# Altium footprint library WR-TBL_Rising Cage Clamp.PcbLib: 435 footprints (part 7 of 28)
Each footprint in its own frame and in the unit in brackets; x right, y up, seen from the top. Pads: shape width x height; smd on the part's side, far side on the other; paste and mask are expansions set on the pad; w line width, h text height; cw(c..) or ccw(c..) is an arc to the next point about the centre after c.
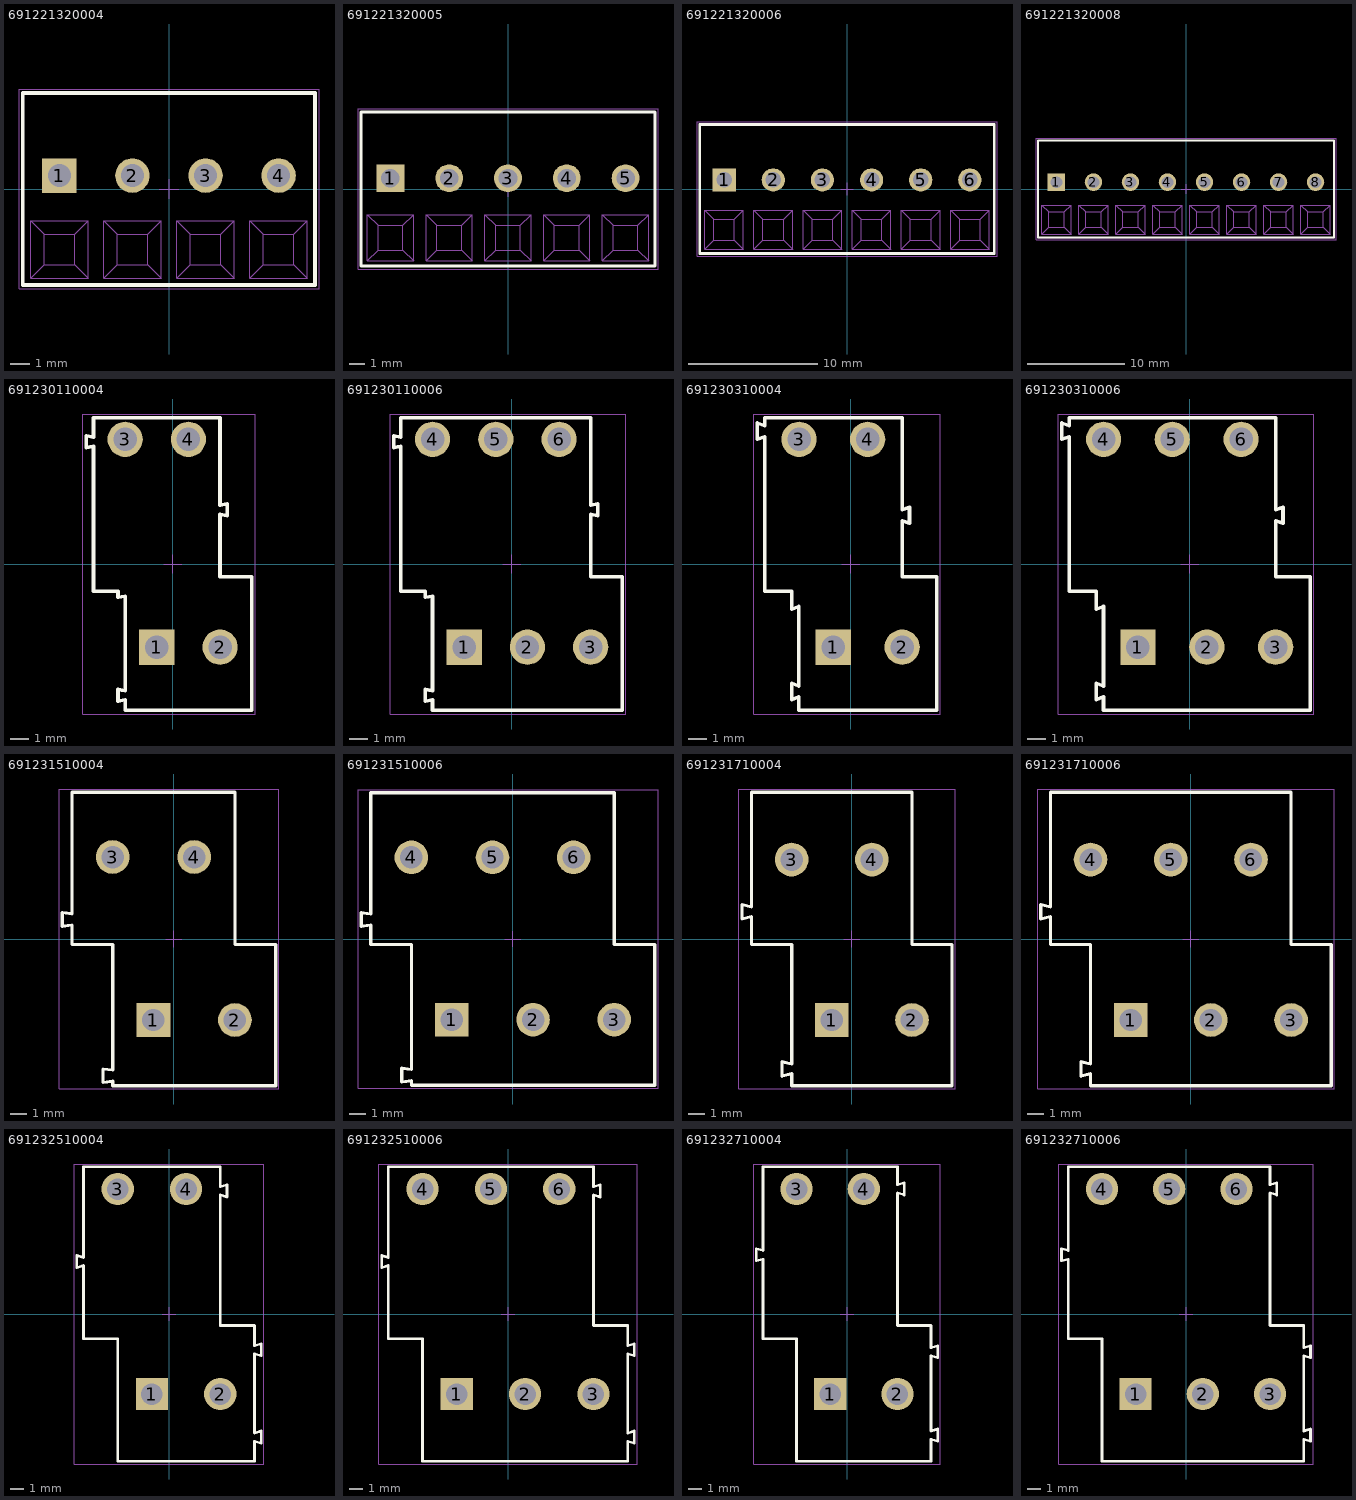
[diagram p6: the footprints below, top view; thin cyan lines are the x and y axes]

## 691221320004 [mm] "3,81mm - modular - green - 55° wire entry - Cage clamp - 04p"
height 9.5
pads (4):
  rect 1.8x1.8 hole 1.2: 1(-5.715,0.7)
  round 1.8 hole 1.2: 2(-1.905,0.7) 3(1.905,0.7) 4(5.715,0.7)
Top Overlay:
  lines w0.2: -7.62,-5 7.62,-5 7.62,5 -7.62,5 -7.62,-5
Mechanical 13:
  lines w0.05: -7.215,-4.66 -4.215,-4.66 ; -7.215,-4.66 -7.215,-1.66 ; -7.215,-4.66 -6.515,-3.96 ; -7.215,-1.66 -4.215,-1.66 ; -7.215,-1.66 -6.515,-2.36 ; -6.515,-3.96 -6.515,-2.36 ; -6.515,-3.96 -4.915,-3.96 ; -6.515,-2.36 -4.915,-2.36 ; -4.915,-3.96 -4.915,-2.36 ; -4.915,-3.96 -4.215,-4.66 ; -4.915,-2.36 -4.215,-1.66 ; -4.215,-4.66 -4.215,-1.66 ; -3.405,-4.66 -2.705,-3.96 ; -3.405,-4.66 -3.405,-1.66 ; -3.405,-4.66 -0.405,-4.66 ; -3.405,-1.66 -2.705,-2.36 ; -3.405,-1.66 -0.405,-1.66 ; -2.705,-3.96 -1.105,-3.96 ; -2.705,-3.96 -2.705,-2.36 ; -2.705,-2.36 -1.105,-2.36 ; -1.105,-3.96 -0.405,-4.66 ; -1.105,-3.96 -1.105,-2.36 ; -1.105,-2.36 -0.405,-1.66 ; -0.405,-4.66 -0.405,-1.66 ; 0.405,-4.66 1.105,-3.96 ; 0.405,-4.66 0.405,-1.66 ; 0.405,-4.66 3.405,-4.66 ; 0.405,-1.66 1.105,-2.36 ; 0.405,-1.66 3.405,-1.66 ; 1.105,-3.96 2.705,-3.96 ; 1.105,-3.96 1.105,-2.36 ; 1.105,-2.36 2.705,-2.36 ; 2.705,-3.96 3.405,-4.66 ; 2.705,-3.96 2.705,-2.36 ; 2.705,-2.36 3.405,-1.66 ; 3.405,-4.66 3.405,-1.66 ; 4.215,-4.66 4.915,-3.96 ; 4.215,-4.66 4.215,-1.66 ; 4.215,-4.66 7.215,-4.66 ; 4.215,-1.66 4.915,-2.36 ; 4.215,-1.66 7.215,-1.66 ; 4.915,-3.96 6.515,-3.96 ; 4.915,-3.96 4.915,-2.36 ; 4.915,-2.36 6.515,-2.36 ; 6.515,-3.96 7.215,-4.66 ; 6.515,-3.96 6.515,-2.36 ; 6.515,-2.36 7.215,-1.66 ; 7.215,-4.66 7.215,-1.66
  lines w0.1: -7.62,-5 -7.62,5 7.62,5 7.62,-5 -7.62,-5
Mechanical 15:
  lines w0.05: -0.5,0 0.5,0 ; 0,-0.5 0,0.5 ; -7.82,-5.2 7.82,-5.2 7.82,5.2 -7.82,5.2 -7.82,-5.2
3D body "691221320004.stp": height 9.55, standoff -3.45, extent -7.62,-5 7.62,5

## 691221320005 [mm] "3,81mm - modular - green - 55° wire entry - Cage clamp - 05p"
height 9.5
pads (5):
  rect 1.8x1.8 hole 1.2: 1(-7.62,0.7)
  round 1.8 hole 1.2: 2(-3.81,0.7) 3(0,0.7) 4(3.81,0.7) 5(7.62,0.7)
Top Overlay:
  lines w0.2: -9.525,-5 -9.525,5 9.525,5 9.525,-5 -9.525,-5
Mechanical 13:
  lines w0.05: -9.12,-4.66 -8.42,-3.96 ; -9.12,-4.66 -9.12,-1.66 ; -9.12,-4.66 -6.12,-4.66 ; -9.12,-1.66 -8.42,-2.36 ; -9.12,-1.66 -6.12,-1.66 ; -8.42,-3.96 -6.82,-3.96 ; -8.42,-3.96 -8.42,-2.36 ; -8.42,-2.36 -6.82,-2.36 ; -6.82,-3.96 -6.12,-4.66 ; -6.82,-3.96 -6.82,-2.36 ; -6.82,-2.36 -6.12,-1.66 ; -6.12,-4.66 -6.12,-1.66 ; -5.31,-4.66 -2.31,-4.66 ; -5.31,-4.66 -5.31,-1.66 ; -5.31,-4.66 -4.61,-3.96 ; -5.31,-1.66 -2.31,-1.66 ; -5.31,-1.66 -4.61,-2.36 ; -4.61,-3.96 -4.61,-2.36 ; -4.61,-3.96 -3.01,-3.96 ; -4.61,-2.36 -3.01,-2.36 ; -3.01,-3.96 -3.01,-2.36 ; -3.01,-3.96 -2.31,-4.66 ; -3.01,-2.36 -2.31,-1.66 ; -2.31,-4.66 -2.31,-1.66 ; -1.5,-4.66 1.5,-4.66 ; -1.5,-4.66 -1.5,-1.66 ; -1.5,-4.66 -0.8,-3.96 ; -1.5,-1.66 1.5,-1.66 ; -1.5,-1.66 -0.8,-2.36 ; -0.8,-3.96 -0.8,-2.36 ; -0.8,-3.96 0.8,-3.96 ; -0.8,-2.36 0.8,-2.36 ; 0.8,-3.96 0.8,-2.36 ; 0.8,-3.96 1.5,-4.66 ; 0.8,-2.36 1.5,-1.66 ; 1.5,-4.66 1.5,-1.66 ; 2.31,-4.66 5.31,-4.66 ; 2.31,-4.66 2.31,-1.66 ; 2.31,-4.66 3.01,-3.96 ; 2.31,-1.66 5.31,-1.66 ; 2.31,-1.66 3.01,-2.36 ; 3.01,-3.96 3.01,-2.36 ; 3.01,-3.96 4.61,-3.96 ; 3.01,-2.36 4.61,-2.36 ; 4.61,-3.96 4.61,-2.36 ; 4.61,-3.96 5.31,-4.66 ; 4.61,-2.36 5.31,-1.66 ; 5.31,-4.66 5.31,-1.66 ; 6.12,-4.66 9.12,-4.66 ; 6.12,-4.66 6.12,-1.66 ; 6.12,-4.66 6.82,-3.96 ; 6.12,-1.66 9.12,-1.66 ; 6.12,-1.66 6.82,-2.36 ; 6.82,-3.96 6.82,-2.36 ; 6.82,-3.96 8.42,-3.96 ; 6.82,-2.36 8.42,-2.36 ; 8.42,-3.96 8.42,-2.36 ; 8.42,-3.96 9.12,-4.66 ; 8.42,-2.36 9.12,-1.66 ; 9.12,-4.66 9.12,-1.66
  lines w0.1: -9.525,-5 9.525,-5 9.525,5 -9.525,5 -9.525,-5
Mechanical 15:
  lines w0.05: -0.5,0 0.5,0 ; 0,-0.5 0,0.5 ; -9.725,-5.2 -9.725,5.2 9.725,5.2 9.725,-5.2 -9.725,-5.2
3D body "691221320005.stp": height 9.55, standoff -3.45, extent -9.525,-5 9.525,5

## 691221320006 [mm] "3,81mm - modular - green - 55° wire entry - Cage clamp - 06p"
height 9.5
pads (6):
  rect 1.8x1.8 hole 1.2: 1(-9.525,0.7)
  round 1.8 hole 1.2: 2(-5.715,0.7) 3(-1.905,0.7) 4(1.905,0.7) 5(5.715,0.7) 6(9.525,0.7)
Top Overlay:
  lines w0.2: -11.43,-5 -11.43,5 11.43,5 11.43,-5 -11.43,-5
Mechanical 13:
  lines w0.05: -11.025,-4.66 -10.325,-3.96 ; -11.025,-4.66 -11.025,-1.66 ; -11.025,-4.66 -8.025,-4.66 ; -11.025,-1.66 -10.325,-2.36 ; -11.025,-1.66 -8.025,-1.66 ; -10.325,-3.96 -8.725,-3.96 ; -10.325,-3.96 -10.325,-2.36 ; -10.325,-2.36 -8.725,-2.36 ; -8.725,-3.96 -8.025,-4.66 ; -8.725,-3.96 -8.725,-2.36 ; -8.725,-2.36 -8.025,-1.66 ; -8.025,-4.66 -8.025,-1.66 ; -7.215,-4.66 -4.215,-4.66 ; -7.215,-4.66 -7.215,-1.66 ; -7.215,-4.66 -6.515,-3.96 ; -7.215,-1.66 -4.215,-1.66 ; -7.215,-1.66 -6.515,-2.36 ; -6.515,-3.96 -6.515,-2.36 ; -6.515,-3.96 -4.915,-3.96 ; -6.515,-2.36 -4.915,-2.36 ; -4.915,-3.96 -4.915,-2.36 ; -4.915,-3.96 -4.215,-4.66 ; -4.915,-2.36 -4.215,-1.66 ; -4.215,-4.66 -4.215,-1.66 ; -3.405,-4.66 -0.405,-4.66 ; -3.405,-4.66 -3.405,-1.66 ; -3.405,-4.66 -2.705,-3.96 ; -3.405,-1.66 -0.405,-1.66 ; -3.405,-1.66 -2.705,-2.36 ; -2.705,-3.96 -2.705,-2.36 ; -2.705,-3.96 -1.105,-3.96 ; -2.705,-2.36 -1.105,-2.36 ; -1.105,-3.96 -1.105,-2.36 ; -1.105,-3.96 -0.405,-4.66 ; -1.105,-2.36 -0.405,-1.66 ; -0.405,-4.66 -0.405,-1.66 ; 0.405,-4.66 3.405,-4.66 ; 0.405,-4.66 0.405,-1.66 ; 0.405,-4.66 1.105,-3.96 ; 0.405,-1.66 3.405,-1.66 ; 0.405,-1.66 1.105,-2.36 ; 1.105,-3.96 1.105,-2.36 ; 1.105,-3.96 2.705,-3.96 ; 1.105,-2.36 2.705,-2.36 ; 2.705,-3.96 2.705,-2.36 ; 2.705,-3.96 3.405,-4.66 ; 2.705,-2.36 3.405,-1.66 ; 3.405,-4.66 3.405,-1.66 ; 4.215,-4.66 7.215,-4.66 ; 4.215,-4.66 4.215,-1.66 ; 4.215,-4.66 4.915,-3.96 ; 4.215,-1.66 7.215,-1.66 ; 4.215,-1.66 4.915,-2.36 ; 4.915,-3.96 4.915,-2.36 ; 4.915,-3.96 6.515,-3.96 ; 4.915,-2.36 6.515,-2.36 ; 6.515,-3.96 6.515,-2.36 ; 6.515,-3.96 7.215,-4.66 ; 6.515,-2.36 7.215,-1.66 ; 7.215,-4.66 7.215,-1.66 ; 8.025,-4.66 8.725,-3.96 ; 8.025,-4.66 8.025,-1.66 ; 8.025,-4.66 11.025,-4.66 ; 8.025,-1.66 8.725,-2.36 ; 8.025,-1.66 11.025,-1.66 ; 8.725,-3.96 10.325,-3.96 ; 8.725,-3.96 8.725,-2.36 ; 8.725,-2.36 10.325,-2.36 ; 10.325,-3.96 11.025,-4.66 ; 10.325,-3.96 10.325,-2.36 ; 10.325,-2.36 11.025,-1.66 ; 11.025,-4.66 11.025,-1.66
  lines w0.1: -11.43,-5 11.43,-5 11.43,5 -11.43,5 -11.43,-5
Mechanical 15:
  lines w0.05: -0.5,0 0.5,0 ; 0,-0.5 0,0.5 ; -11.63,-5.2 -11.63,5.2 11.63,5.2 11.63,-5.2 -11.63,-5.2
3D body "691221320006.stp": height 9.55, standoff -3.45, extent -11.43,-5 11.43,5

## 691221320008 [mm] "3,81mm - modular - green - 55° wire entry - Cage clamp - 08p"
height 9.5
pads (8):
  rect 1.8x1.8 hole 1.2: 1(-13.335,0.7)
  round 1.8 hole 1.2: 2(-9.525,0.7) 3(-5.715,0.7) 4(-1.905,0.7) 5(1.905,0.7) 6(5.715,0.7) 7(9.525,0.7) 8(13.335,0.7)
Top Overlay:
  lines w0.2: -15.24,-5 -15.24,5 15.24,5 15.24,-5 -15.24,-5
Mechanical 13:
  lines w0.05: -14.835,-4.66 -14.135,-3.96 ; -14.835,-4.66 -14.835,-1.66 ; -14.835,-4.66 -11.835,-4.66 ; -14.835,-1.66 -14.135,-2.36 ; -14.835,-1.66 -11.835,-1.66 ; -14.135,-3.96 -12.535,-3.96 ; -14.135,-3.96 -14.135,-2.36 ; -14.135,-2.36 -12.535,-2.36 ; -12.535,-3.96 -11.835,-4.66 ; -12.535,-3.96 -12.535,-2.36 ; -12.535,-2.36 -11.835,-1.66 ; -11.835,-4.66 -11.835,-1.66 ; -11.025,-4.66 -8.025,-4.66 ; -11.025,-4.66 -11.025,-1.66 ; -11.025,-4.66 -10.325,-3.96 ; -11.025,-1.66 -8.025,-1.66 ; -11.025,-1.66 -10.325,-2.36 ; -10.325,-3.96 -10.325,-2.36 ; -10.325,-3.96 -8.725,-3.96 ; -10.325,-2.36 -8.725,-2.36 ; -8.725,-3.96 -8.725,-2.36 ; -8.725,-3.96 -8.025,-4.66 ; -8.725,-2.36 -8.025,-1.66 ; -8.025,-4.66 -8.025,-1.66 ; -7.215,-4.66 -4.215,-4.66 ; -7.215,-4.66 -7.215,-1.66 ; -7.215,-4.66 -6.515,-3.96 ; -7.215,-1.66 -4.215,-1.66 ; -7.215,-1.66 -6.515,-2.36 ; -6.515,-3.96 -6.515,-2.36 ; -6.515,-3.96 -4.915,-3.96 ; -6.515,-2.36 -4.915,-2.36 ; -4.915,-3.96 -4.915,-2.36 ; -4.915,-3.96 -4.215,-4.66 ; -4.915,-2.36 -4.215,-1.66 ; -4.215,-4.66 -4.215,-1.66 ; -3.405,-4.66 -0.405,-4.66 ; -3.405,-4.66 -3.405,-1.66 ; -3.405,-4.66 -2.705,-3.96 ; -3.405,-1.66 -0.405,-1.66 ; -3.405,-1.66 -2.705,-2.36 ; -2.705,-3.96 -2.705,-2.36 ; -2.705,-3.96 -1.105,-3.96 ; -2.705,-2.36 -1.105,-2.36 ; -1.105,-3.96 -1.105,-2.36 ; -1.105,-3.96 -0.405,-4.66 ; -1.105,-2.36 -0.405,-1.66 ; -0.405,-4.66 -0.405,-1.66 ; 0.405,-4.66 3.405,-4.66 ; 0.405,-4.66 0.405,-1.66 ; 0.405,-4.66 1.105,-3.96 ; 0.405,-1.66 3.405,-1.66 ; 0.405,-1.66 1.105,-2.36 ; 1.105,-3.96 1.105,-2.36 ; 1.105,-3.96 2.705,-3.96 ; 1.105,-2.36 2.705,-2.36 ; 2.705,-3.96 2.705,-2.36 ; 2.705,-3.96 3.405,-4.66 ; 2.705,-2.36 3.405,-1.66 ; 3.405,-4.66 3.405,-1.66 ; 4.215,-4.66 4.915,-3.96 ; 4.215,-4.66 4.215,-1.66 ; 4.215,-4.66 7.215,-4.66 ; 4.215,-1.66 4.915,-2.36 ; 4.215,-1.66 7.215,-1.66 ; 4.915,-3.96 6.515,-3.96 ; 4.915,-3.96 4.915,-2.36 ; 4.915,-2.36 6.515,-2.36 ; 6.515,-3.96 7.215,-4.66 ; 6.515,-3.96 6.515,-2.36 ; 6.515,-2.36 7.215,-1.66 ; 7.215,-4.66 7.215,-1.66 ; 8.025,-4.66 11.025,-4.66 ; 8.025,-4.66 8.025,-1.66 ; 8.025,-4.66 8.725,-3.96 ; 8.025,-1.66 11.025,-1.66 ; 8.025,-1.66 8.725,-2.36 ; 8.725,-3.96 8.725,-2.36 ; 8.725,-3.96 10.325,-3.96 ; 8.725,-2.36 10.325,-2.36 ; 10.325,-3.96 10.325,-2.36 ; 10.325,-3.96 11.025,-4.66 ; 10.325,-2.36 11.025,-1.66 ; 11.025,-4.66 11.025,-1.66 ; 11.835,-4.66 14.835,-4.66 ; 11.835,-4.66 11.835,-1.66 ; 11.835,-4.66 12.535,-3.96 ; 11.835,-1.66 14.835,-1.66 ; 11.835,-1.66 12.535,-2.36 ; 12.535,-3.96 12.535,-2.36 ; 12.535,-3.96 14.135,-3.96 ; 12.535,-2.36 14.135,-2.36 ; 14.135,-3.96 14.135,-2.36 ; 14.135,-3.96 14.835,-4.66 ; 14.135,-2.36 14.835,-1.66 ; 14.835,-4.66 14.835,-1.66
  lines w0.1: -15.24,-5 15.24,-5 15.24,5 -15.24,5 -15.24,-5
Mechanical 15:
  lines w0.05: -0.5,0 0.5,0 ; 0,-0.5 0,0.5 ; -15.44,-5.2 -15.44,5.2 15.44,5.2 15.44,-5.2 -15.44,-5.2
3D body "691221320008.stp": height 9.55, standoff -3.45, extent -15.24,-5 15.24,5

## 691230110004 [mm] "3,50mm - modular - 2 rows - Right - horizontal entry with rising cage clamp - 04p"
height 16.2
pads (4):
  rect 1.95x1.95 hole 1.3: 1(-0.875,-4.6)
  round 1.95 hole 1.3: 2(2.625,-4.6) 3(-2.625,6.9) 4(0.875,6.9)
Top Overlay:
  lines w0.2: -4.775,6.445 -4.375,6.52 -4.375,-1.5 -3.025,-1.5 -3.025,-1.85 -2.625,-1.78 -2.625,-7.02 -3.025,-6.945 -3.025,-7.595 -2.625,-7.52 -2.625,-8.1 4.375,-8.1 4.375,-0.7 2.625,-0.7 2.625,2.75 3.025,2.675 3.025,3.325 2.625,3.25 2.625,8.1 -4.375,8.1 -4.375,7.02 -4.775,7.095 -4.775,6.445
Mechanical 13:
  lines w0.1: -4.775,6.445 -4.775,7.095 -4.375,7.02 -4.375,8.1 2.625,8.1 2.625,3.25 3.025,3.325 3.025,2.675 2.625,2.75 2.625,-0.7 4.375,-0.7 4.375,-8.1 -2.625,-8.1 -2.625,-7.52 -3.025,-7.595 -3.025,-6.945 -2.625,-7.02 -2.625,-1.78 -3.025,-1.85 -3.025,-1.5 -4.375,-1.5 -4.375,6.52 -4.775,6.445
Mechanical 15:
  lines w0.05: -0.5,0 0.5,0 ; 0,-0.5 0,0.5 ; -4.975,-8.3 -4.975,8.3 4.575,8.3 4.575,-8.3 -4.975,-8.3
3D body "691230110004.stp": height 16.3, standoff -3.6, extent -4.842,-8.1 4.375,8.1

## 691230110006 [mm] "3,50mm - modular - 2 rows - Right - horizontal entry with rising cage clamp - 06p"
height 16.2
pads (6):
  rect 1.95x1.95 hole 1.3: 1(-2.625,-4.6)
  round 1.95 hole 1.3: 2(0.875,-4.6) 3(4.375,-4.6) 4(-4.375,6.9) 5(-0.875,6.9) 6(2.625,6.9)
Top Overlay:
  lines w0.2: -6.525,6.445 -6.125,6.52 -6.125,-1.5 -4.775,-1.5 -4.775,-1.85 -4.375,-1.78 -4.375,-7.02 -4.775,-6.945 -4.775,-7.595 -4.375,-7.52 -4.375,-8.1 6.125,-8.1 6.125,-0.7 4.375,-0.7 4.375,2.75 4.775,2.675 4.775,3.325 4.375,3.25 4.375,8.1 -6.125,8.1 -6.125,7.02 -6.525,7.095 -6.525,6.445
Mechanical 13:
  lines w0.1: -6.525,6.445 -6.525,7.095 -6.125,7.02 -6.125,8.1 4.375,8.1 4.375,3.25 4.775,3.325 4.775,2.675 4.375,2.75 4.375,-0.7 6.125,-0.7 6.125,-8.1 -4.375,-8.1 -4.375,-7.52 -4.775,-7.595 -4.775,-6.945 -4.375,-7.02 -4.375,-1.78 -4.775,-1.85 -4.775,-1.5 -6.125,-1.5 -6.125,6.52 -6.525,6.445
Mechanical 15:
  lines w0.05: -0.5,0 0.5,0 ; 0,-0.5 0,0.5 ; -6.725,-8.3 -6.725,8.3 6.325,8.3 6.325,-8.3 -6.725,-8.3
3D body "691230110006.stp": height 16.3, standoff -3.6, extent -6.572,-8.1 6.125,8.1

## 691230310004 [mm] "3,81mm - modular - 2 rows - Right - horizontal entry with rising cage clamp - 04p"
height 16.2
pads (4):
  rect 1.95x1.95 hole 1.3: 1(-0.955,-4.6)
  round 1.95 hole 1.3: 2(2.855,-4.6) 3(-2.855,6.9) 4(0.945,6.9)
Top Overlay:
  lines w0.2: -5.16,6.9 -5.16,7.8 -4.76,7.65 -4.76,8.1 2.86,8.1 2.86,3 3.26,3.15 3.26,2.25 2.86,2.4 2.86,-0.7 4.76,-0.7 4.76,-8.1 -2.86,-8.1 -2.86,-7.35 -3.26,-7.5 -3.26,-6.6 -2.86,-6.75 -2.86,-2.35 -3.26,-2.5 -3.26,-1.5 -4.76,-1.5 -4.76,7.05 -5.16,6.9
Mechanical 13:
  lines w0.1: -5.16,6.9 -4.76,7.05 -4.76,-1.5 -3.26,-1.5 -3.26,-2.5 -2.86,-2.35 -2.86,-6.75 -3.26,-6.6 -3.26,-7.5 -2.86,-7.35 -2.86,-8.1 4.76,-8.1 4.76,-0.7 2.86,-0.7 2.86,2.4 3.26,2.25 3.26,3.15 2.86,3 2.86,8.1 -4.76,8.1 -4.76,7.65 -5.16,7.8 -5.16,6.9
Mechanical 15:
  lines w0.05: -0.5,0 0.5,0 ; 0,-0.5 0,0.5 ; -5.36,-8.3 4.96,-8.3 4.96,8.3 -5.36,8.3 -5.36,-8.3
3D body "691230310004.stp": height 16.35, standoff -3.65, extent -5.125,-8.1 4.76,8

## 691230310006 [mm] "3,81mm - modular - 2 rows - Right - horizontal entry with rising cage clamp - 06p"
height 16.2
pads (6):
  rect 1.95x1.95 hole 1.3: 1(-2.86,-4.6)
  round 1.95 hole 1.3: 2(0.95,-4.6) 3(4.76,-4.6) 4(-4.76,6.9) 5(-0.96,6.9) 6(2.85,6.9)
Top Overlay:
  lines w0.2: -7.065,6.9 -6.665,7.05 -6.665,-1.5 -5.165,-1.5 -5.165,-2.5 -4.765,-2.35 -4.765,-6.75 -5.165,-6.6 -5.165,-7.5 -4.765,-7.35 -4.765,-8.1 6.665,-8.1 6.665,-0.7 4.765,-0.7 4.765,2.4 5.165,2.25 5.165,3.15 4.765,3 4.765,8.1 -6.665,8.1 -6.665,7.65 -7.065,7.8 -7.065,6.9
Mechanical 13:
  lines w0.1: -7.065,6.9 -7.065,7.8 -6.665,7.65 -6.665,8.1 4.765,8.1 4.765,3 5.165,3.15 5.165,2.25 4.765,2.4 4.765,-0.7 6.665,-0.7 6.665,-8.1 -4.765,-8.1 -4.765,-7.35 -5.165,-7.5 -5.165,-6.6 -4.765,-6.75 -4.765,-2.35 -5.165,-2.5 -5.165,-1.5 -6.665,-1.5 -6.665,7.05 -7.065,6.9
Mechanical 15:
  lines w0.05: -0.5,0 0.5,0 ; 0,-0.5 0,0.5 ; -7.265,-8.3 -7.265,8.3 6.865,8.3 6.865,-8.3 -7.265,-8.3
3D body "691230310006.stp": height 16.35, standoff -3.65, extent -7.075,-8.05 6.62,8.05

## 691231510004 [mm] "5,08mm - modular - 2 rows - Right - horizontal entry with rising cage clamp - 04p - h=19,1mm"
height 19.1
pads (4):
  rect 2.1x2.1 hole 1.4: 1(-1.27,-5.05)
  round 2.1 hole 1.4: 2(3.81,-5.05) 3(-3.81,5.11) 4(1.27,5.11)
Top Overlay:
  lines w0.2: -6.95,0.795 -6.35,0.87 -6.35,-0.35 -3.81,-0.35 -3.81,-8.17 -4.41,-8.095 -4.41,-8.945 -3.81,-8.87 -3.81,-9.15 6.35,-9.15 6.35,-0.35 3.81,-0.35 3.81,9.15 -6.35,9.15 -6.35,1.57 -6.95,1.645 -6.95,0.795
Mechanical 13:
  lines w0.1: -6.95,0.795 -6.95,1.645 -6.35,1.57 -6.35,9.15 3.81,9.15 3.81,-0.35 6.35,-0.35 6.35,-9.15 -3.81,-9.15 -3.81,-8.87 -4.41,-8.945 -4.41,-8.095 -3.81,-8.17 -3.81,-0.35 -6.35,-0.35 -6.35,0.87 -6.95,0.795
Mechanical 15:
  lines w0.05: -0.5,0 0.5,0 ; 0,-0.5 0,0.5 ; -7.15,-9.35 6.55,-9.35 6.55,9.35 -7.15,9.35 -7.15,-9.35
3D body "691231510004.stp": height 19.15, standoff -3.45, extent -6.95,-9.15 6.35,9.15

## 691231510006 [mm] "5,08mm - modular - 2 rows - Right - horizontal entry with rising cage clamp - 06p - h=19,1mm"
height 19.1
pads (6):
  rect 2.1x2.1 hole 1.4: 1(-3.81,-5.05)
  round 2.1 hole 1.4: 2(1.27,-5.05) 3(6.35,-5.05) 4(-6.35,5.11) 5(-1.27,5.11) 6(3.81,5.11)
Top Overlay:
  lines w0.2: -9.49,0.795 -9.49,1.645 -8.89,1.57 -8.89,9.15 6.35,9.15 6.35,-0.35 8.89,-0.35 8.89,-9.15 -6.35,-9.15 -6.35,-8.87 -6.95,-8.945 -6.95,-8.095 -6.35,-8.17 -6.35,-0.35 -8.89,-0.35 -8.89,0.87 -9.49,0.795
Mechanical 13:
  lines w0.1: -9.49,0.795 -8.89,0.87 -8.89,-0.35 -6.35,-0.35 -6.35,-8.17 -6.95,-8.095 -6.95,-8.945 -6.35,-8.87 -6.35,-9.15 8.89,-9.15 8.89,-0.35 6.35,-0.35 6.35,9.15 -8.89,9.15 -8.89,1.57 -9.49,1.645 -9.49,0.795
Mechanical 15:
  lines w0.05: -0.5,0 0.5,0 ; 0,-0.5 0,0.5 ; -9.69,-9.35 -9.69,9.35 9.09,9.35 9.09,-9.35 -9.69,-9.35
3D body "691231510006.stp": height 19.15, standoff -3.45, extent -9.49,-9.15 8.89,9.15

## 691231710004 [mm] "5,00mm - modular - 2 rows - Right - horizontal entry with rising cage clamp - 04p - h=19,1mm"
height 19.1
pads (4):
  rect 2.1x2.1 hole 1.4: 1(-1.25,-5.05)
  round 2.1 hole 1.4: 2(3.75,-5.05) 3(-3.75,4.95) 4(1.25,4.95)
Top Overlay:
  lines w0.2: -6.85,1.25 -6.25,1.4 -6.25,-0.35 -3.75,-0.35 -3.75,-7.8 -4.35,-7.65 -4.35,-8.55 -3.75,-8.4 -3.75,-9.15 6.25,-9.15 6.25,-0.35 3.75,-0.35 3.75,9.15 -6.25,9.15 -6.25,2 -6.85,2.15 -6.85,1.25
Mechanical 13:
  lines w0.1: -6.85,1.25 -6.85,2.15 -6.25,2 -6.25,9.15 3.75,9.15 3.75,-0.35 6.25,-0.35 6.25,-9.15 -3.75,-9.15 -3.75,-8.4 -4.35,-8.55 -4.35,-7.65 -3.75,-7.8 -3.75,-0.35 -6.25,-0.35 -6.25,1.4 -6.85,1.25
Mechanical 15:
  lines w0.05: -0.5,0 0.5,0 ; 0,-0.5 0,0.5 ; -7.05,-9.35 6.45,-9.35 6.45,9.35 -7.05,9.35 -7.05,-9.35
3D body "691231710004.stp": height 19.15, standoff -3.45, extent -6.85,-9.15 6.25,9.15

## 691231710006 [mm] "5,00mm - modular - 2 rows - Right - horizontal entry with rising cage clamp - 06p - h=19,1mm"
height 19.1
pads (6):
  rect 2.1x2.1 hole 1.4: 1(-3.75,-5.05)
  round 2.1 hole 1.4: 2(1.25,-5.05) 3(6.25,-5.05) 4(-6.25,4.95) 5(-1.25,4.95) 6(3.75,4.95)
Top Overlay:
  lines w0.2: -9.35,1.25 -8.75,1.4 -8.75,-0.35 -6.25,-0.35 -6.25,-7.8 -6.85,-7.65 -6.85,-8.55 -6.25,-8.4 -6.25,-9.15 8.75,-9.15 8.75,-0.35 6.25,-0.35 6.25,9.15 -8.75,9.15 -8.75,2 -9.35,2.15 -9.35,1.25
Mechanical 13:
  lines w0.1: -9.35,1.25 -9.35,2.15 -8.75,2 -8.75,9.15 6.25,9.15 6.25,-0.35 8.75,-0.35 8.75,-9.15 -6.25,-9.15 -6.25,-8.4 -6.85,-8.55 -6.85,-7.65 -6.25,-7.8 -6.25,-0.35 -8.75,-0.35 -8.75,1.4 -9.35,1.25
Mechanical 15:
  lines w0.05: -0.5,0 0.5,0 ; 0,-0.5 0,0.5 ; -9.55,-9.35 8.95,-9.35 8.95,9.35 -9.55,9.35 -9.55,-9.35
3D body "691231710006.stp": height 19.15, standoff -3.45, extent -9.35,-9.15 8.75,9.15

## 691232510004 [mm] "5,08mm - modular - 2 rows - Right - horizontal entry with rising cage clamp - 04p - h=25,3mm"
height 25.3
pads (4):
  rect 2.4x2.4 hole 1.6: 1(-1.27,-5.95)
  round 2.4 hole 1.6: 2(3.81,-5.95) 3(-3.81,9.29) 4(1.27,9.29)
Top Overlay:
  lines w0.2: -6.35,-1.85 -3.81,-1.85 -3.81,-10.95 6.35,-10.95 6.35,-9.45 6.85,-9.6 6.85,-8.7 6.35,-8.85 6.35,-2.95 6.85,-3.1 6.85,-2.2 6.35,-2.35 6.35,-0.85 3.81,-0.85 3.81,8.85 4.309,8.697 ; -6.351,-1.849 -6.351,3.602 -6.85,3.45 -6.85,4.35 -6.351,4.198 ; -6.35,4.2 -6.35,10.95 3.81,10.95 3.81,9.45 4.309,9.603 ; 4.31,8.7 4.31,9.6
Mechanical 13:
  lines w0.1: -6.35,-1.85 -3.81,-1.85 -3.81,-10.95 6.35,-10.95 6.35,-9.45 6.85,-9.6 6.85,-8.7 6.35,-8.85 6.35,-2.95 6.85,-3.1 6.85,-2.2 6.35,-2.35 6.35,-0.85 3.81,-0.85 3.81,8.85 4.309,8.697 ; -6.351,-1.849 -6.351,3.602 -6.85,3.45 -6.85,4.35 -6.351,4.198 ; -6.35,4.2 -6.35,10.95 3.81,10.95 3.81,9.45 4.309,9.603 ; 4.31,8.7 4.31,9.6
Mechanical 15:
  lines w0.05: -0.5,0 0.5,0 ; 0,-0.5 0,0.5 ; -7.05,-11.15 7.05,-11.15 7.05,11.15 -7.05,11.15 -7.05,-11.15
3D body "691232510004.stp": height 25.35, standoff -3.45, extent -6.81,-10.95 6.85,10.95

## 691232510006 [mm] "5,08mm - modular - 2 rows - Right - horizontal entry with rising cage clamp - 06p - h=25,3mm"
height 25.3
pads (6):
  rect 2.4x2.4 hole 1.6: 1(-3.81,-5.95)
  round 2.4 hole 1.6: 2(1.27,-5.95) 3(6.35,-5.95) 4(-6.35,9.29) 5(-1.27,9.29) 6(3.81,9.29)
Top Overlay:
  lines w0.2: -8.89,-1.85 -6.35,-1.85 -6.35,-10.95 8.89,-10.95 8.89,-9.45 9.39,-9.6 9.39,-8.7 8.89,-8.85 8.89,-2.95 9.39,-3.1 9.39,-2.2 8.89,-2.35 8.89,-0.85 6.35,-0.85 6.35,8.85 6.849,8.697 ; -8.891,-1.849 -8.891,3.602 -9.39,3.45 -9.39,4.35 -8.891,4.198 ; -8.89,4.2 -8.89,10.95 6.35,10.95 6.35,9.45 6.849,9.603 ; 6.85,8.7 6.85,9.6
Mechanical 13:
  lines w0.1: -8.89,-1.85 -6.35,-1.85 -6.35,-10.95 8.89,-10.95 8.89,-9.45 9.39,-9.6 9.39,-8.7 8.89,-8.85 8.89,-2.95 9.39,-3.1 9.39,-2.2 8.89,-2.35 8.89,-0.85 6.35,-0.85 6.35,8.85 6.849,8.697 ; -8.891,-1.849 -8.891,3.602 -9.39,3.45 -9.39,4.35 -8.891,4.198 ; -8.89,4.2 -8.89,10.95 6.35,10.95 6.35,9.45 6.849,9.603 ; 6.85,8.7 6.85,9.6
Mechanical 15:
  lines w0.05: -0.5,0 0.5,0 ; 0,-0.5 0,0.5 ; -9.59,-11.15 -9.59,11.15 9.59,11.15 9.59,-11.15 -9.59,-11.15
3D body "691232510006.stp": height 25.35, standoff -3.45, extent -9.37,-10.95 9.37,10.95

## 691232710004 [mm] "5,00mm - modular - 2 rows - Right - horizontal entry with rising cage clamp - 04p - h=25,3mm"
height 25.3
pads (4):
  rect 2.4x2.4 hole 1.6: 1(-1.25,-5.95)
  round 2.4 hole 1.6: 2(3.75,-5.95) 3(-3.75,9.29) 4(1.25,9.29)
Top Overlay:
  lines w0.2: -3.85,-1.85 -6.25,-1.85 -6.25,-0.85 -6.25,4.075 -6.75,3.95 -6.75,4.85 -6.25,4.725 -6.25,10.95 3.75,10.95 3.75,9.6 4.25,9.75 4.25,8.85 3.75,9 3.75,-0.85 6.25,-0.85 6.25,-2.5 6.75,-2.35 6.75,-3.25 6.25,-3.1 6.25,-8.7 6.75,-8.55 6.75,-9.45 6.25,-9.3 6.25,-10.95 -3.75,-10.95 -3.75,-1.85
Mechanical 13:
  lines w0.1: -3.85,-1.85 -6.25,-1.85 -6.25,-0.85 -6.25,4.075 -6.75,3.95 -6.75,4.85 -6.25,4.725 -6.25,10.95 3.75,10.95 3.75,9.6 4.25,9.75 4.25,8.85 3.75,9 3.75,-0.85 6.25,-0.85 6.25,-2.5 6.75,-2.35 6.75,-3.25 6.25,-3.1 6.25,-8.7 6.75,-8.55 6.75,-9.45 6.25,-9.3 6.25,-10.95 -3.75,-10.95 -3.75,-1.85
Mechanical 15:
  lines w0.05: -0.5,0 0.5,0 ; 0,-0.5 0,0.5 ; -6.95,-11.15 6.95,-11.15 6.95,11.15 -6.95,11.15 -6.95,-11.15
3D body "691232710004.stp": height 25.35, standoff -3.45, extent -6.8,-10.95 6.8,10.95

## 691232710006 [mm] "5,00mm - modular - 2 rows - Right - horizontal entry with rising cage clamp - 06p - h=25,3mm"
height 25.3
pads (6):
  rect 2.4x2.4 hole 1.6: 1(-3.75,-5.95)
  round 2.4 hole 1.6: 2(1.25,-5.95) 3(6.25,-5.95) 4(-6.25,9.29) 5(-1.25,9.29) 6(3.75,9.29)
Top Overlay:
  lines w0.2: -6.35,-1.85 -8.75,-1.85 -8.75,-0.85 -8.75,4.075 -9.25,3.95 -9.25,4.85 -8.75,4.725 -8.75,10.95 6.25,10.95 6.25,9.6 6.75,9.75 6.75,8.85 6.25,9 6.25,-0.85 8.75,-0.85 8.75,-2.5 9.25,-2.35 9.25,-3.25 8.75,-3.1 8.75,-8.7 9.25,-8.55 9.25,-9.45 8.75,-9.3 8.75,-10.95 -6.25,-10.95 -6.25,-1.85
Mechanical 13:
  lines w0.1: -6.35,-1.85 -8.75,-1.85 -8.75,-0.85 -8.75,4.075 -9.25,3.95 -9.25,4.85 -8.75,4.725 -8.75,10.95 6.25,10.95 6.25,9.6 6.75,9.75 6.75,8.85 6.25,9 6.25,-0.85 8.75,-0.85 8.75,-2.5 9.25,-2.35 9.25,-3.25 8.75,-3.1 8.75,-8.7 9.25,-8.55 9.25,-9.45 8.75,-9.3 8.75,-10.95 -6.25,-10.95 -6.25,-1.85
Mechanical 15:
  lines w0.05: -0.5,0 0.5,0 ; 0,-0.5 0,0.5 ; -9.45,-11.15 9.45,-11.15 9.45,11.15 -9.45,11.15 -9.45,-11.15
3D body "691232710006.stp": height 25.35, standoff -3.45, extent -9.3,-10.95 9.3,10.95